# Altium footprint library Xavier_NX_Carrier_Board_v1.1.PcbLib: 52 footprints (part 1 of 4)
Each footprint in its own frame and in the unit in brackets; x right, y up, seen from the top. Pads: shape width x height; smd on the part's side, far side on the other; paste and mask are expansions set on the pad; w line width, h text height; cw(c..) or ccw(c..) is an arc to the next point about the centre after c.
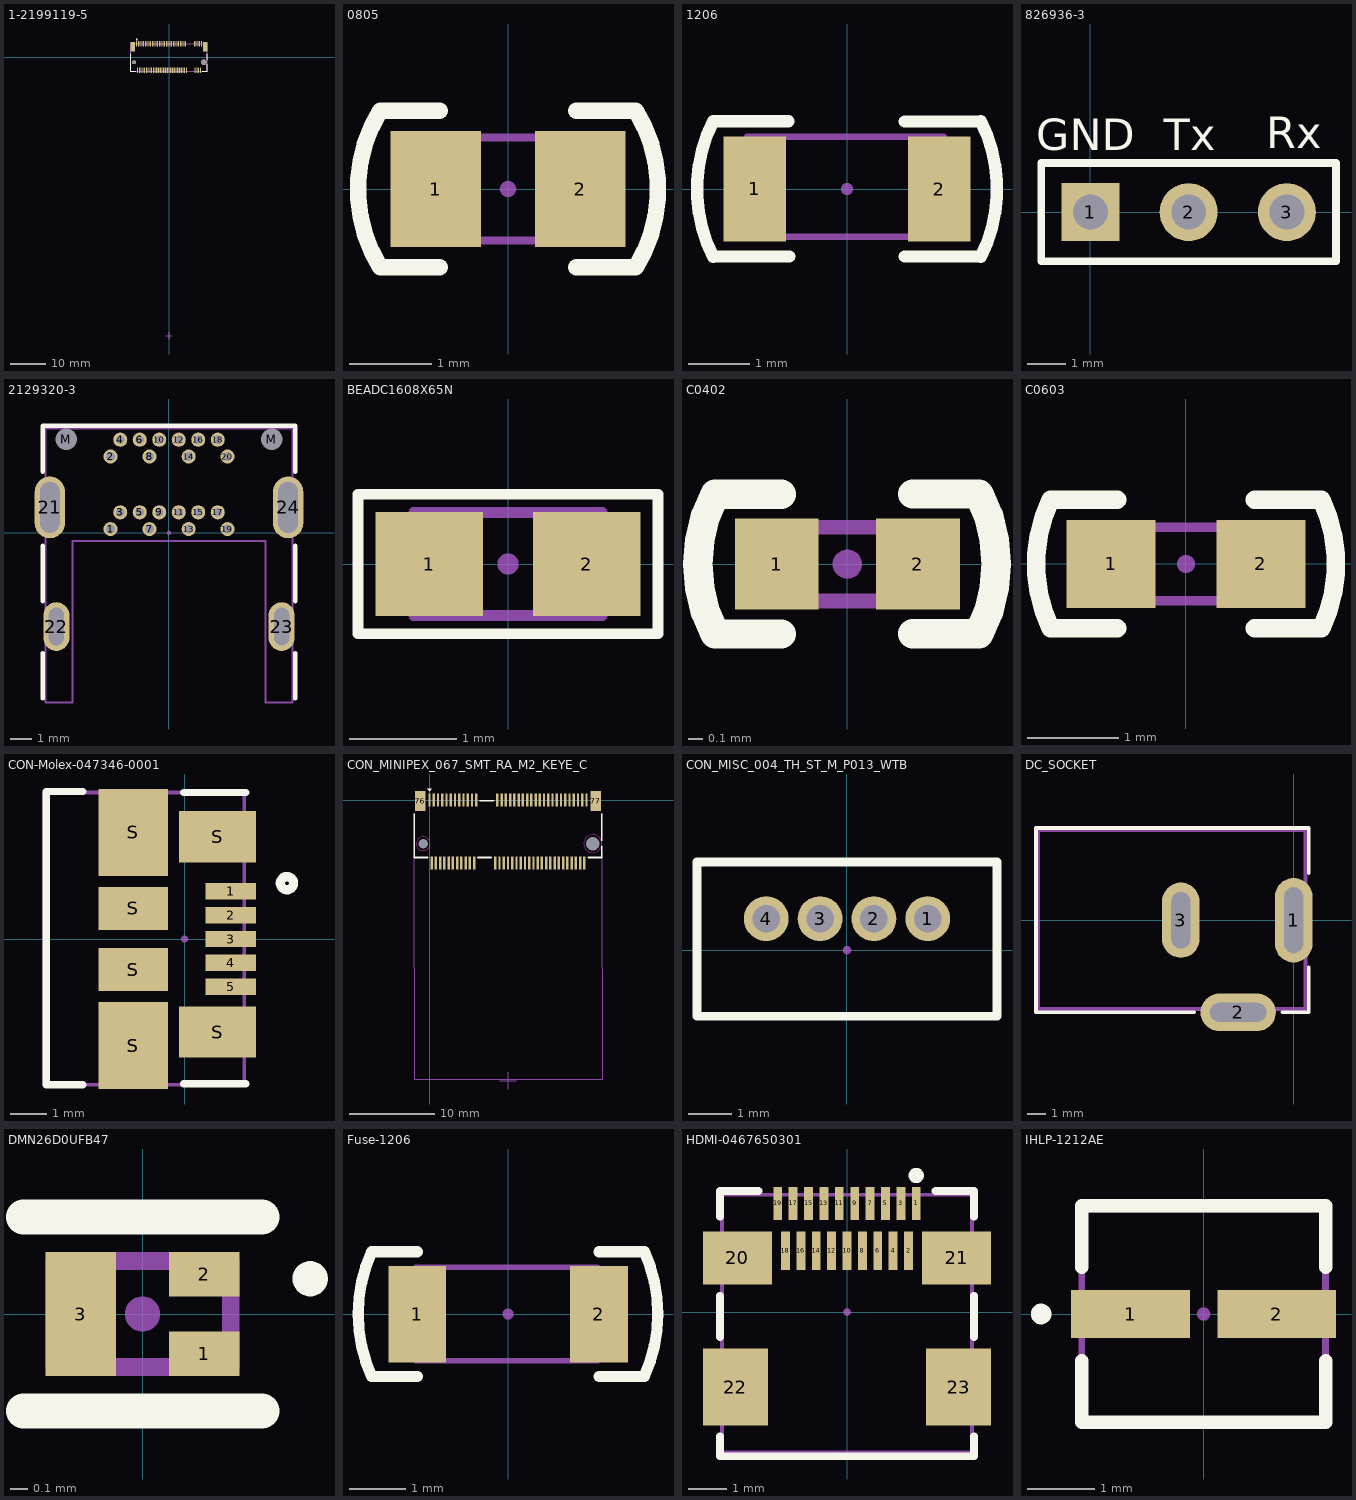
[diagram p0: the footprints below, top view; thin cyan lines are the x and y axes]

## 1-2199119-5 [mm]
pads (72):
  rect 0.3x1.55 smd mask+0.05: 1(-9.25,3.775) 2(-9,-3.775) 3(-8.75,3.775) 4(-8.5,-3.775) 5(-8.25,3.775) 6(-8,-3.775) 7(-7.75,3.775) 8(-7.5,-3.775) 9(-7.25,3.775) 10(-7,-3.775) 11(-6.75,3.775) 12(-6.5,-3.775) 13(-6.25,3.775) 14(-6,-3.775) 15(-5.75,3.775) 16(-5.5,-3.775) 17(-5.25,3.775) 18(-5,-3.775) 19(-4.75,3.775) 20(-4.5,-3.775) 21(-4.25,3.775) 22(-4,-3.775) 23(-3.75,3.775) 24(-3.5,-3.775) 25(-3.25,3.775) 26(-3,-3.775) 27(-2.75,3.775) 28(-2.5,-3.775) 29(-2.25,3.775) 30(-2,-3.775) 31(-1.75,3.775) 32(-1.5,-3.775) 33(-1.25,3.775) 34(-1,-3.775) 35(-0.75,3.775) 36(-0.5,-3.775) 37(-0.25,3.775) 38(0,-3.775) 39(0.25,3.775) 40(0.5,-3.775) 41(0.75,3.775) 42(1,-3.775) 43(1.25,3.775) 44(1.5,-3.775) 45(1.75,3.775) 46(2,-3.775) 47(2.25,3.775) 48(2.5,-3.775) 49(2.75,3.775) 50(3,-3.775) 51(3.25,3.775) 52(3.5,-3.775) 53(3.75,3.775) 54(4,-3.775) 55(4.25,3.775) 56(4.5,-3.775) 57(4.75,3.775) 58(5,-3.775) 67(7.25,3.775) 68(7.5,-3.775) 69(7.75,3.775) 70(8,-3.775) 71(8.25,3.775) 72(8.5,-3.775) 73(8.75,3.775) 74(9,-3.775) 75(9.25,3.775)
  round 1.1 hole 1.1 unplated mask+0.05: None(-10,-1.5)
  round 1.6 hole 1.6 unplated mask+0.05: None(10,-1.5)
  rect 1.2x2.75 smd mask+0.05: SH1(-10.35,3) SH2(10.35,3)
  round 0.2 on Mech4: ""(0,0)
Top Overlay:
  circle w0.2: c-9.225,5.075 r0.1
  lines w0.2: -10.95,1 -10.95,-4 -9.5,-4 ; 9.5,-4 10.95,-4 10.95,-2.1 ; 10.95,-0.9 10.95,1
Mechanical 3:
  lines w0.1: -1,-79.685 1,-79.685 ; 0,-80.685 0,-78.685
Mechanical 4:
  circle w0.2: c-9.25,4.115 r0.1
  circle w0.2: c-9.25,4.115 r0.1
  lines w0.1: -10.95,-4 10.95,-4 ; -10.95,-4 -10.95,3.75 ; -10.95,-4 10.95,-4 ; -10.95,-4 -10.95,3.75 ; -10.95,3.75 10.95,3.75 ; -10.95,3.75 10.95,3.75 ; 10.95,-4 10.95,3.75 ; 10.95,-4 10.95,3.75
3D body "M2 SSD.STEP": height 2.51, standoff 0.65, extent -10.975,-79.575 11.025,0.425
3D body "c-1-2199119-5-c-3d.stp": height 3.09, standoff -0.54, extent -10.97,-4.36 10.93,4.34

## 0805 [mm]
pads (3):
  rect 1.1x1.4 smd mask+0.05: 1(-0.875,0) 2(0.875,0)
  round 0.2 on Mech4: ""(0,0)
Top Overlay:
  lines w0.2: -0.825,-0.95 -1.55,-0.95 cw(c0,0) -1.55,0.95 -0.825,0.95 ; 0.825,-0.95 1.55,-0.95 ccw(c0,0) 1.55,0.95 0.825,0.95
Mechanical 4:
  lines w0.1: -1,-0.625 1,-0.625 1,0.625 -1,0.625 -1,-0.625
3D body "CAP0805.stp": height 0.78, standoff 0, extent -1,-0.625 1,0.625
3D body: height 0.45, standoff 0, extent 1,-0.625 1,0.625
3D body: height 0.45, standoff 0, extent -1,-0.625 -1,0.625

## 1206 [mm]
pads (3):
  rect 1.016x1.7 smd mask+0.05: 1(-1.5,0) 2(1.5,0)
  round 0.2 on Mech4: ""(0,0)
Top Overlay:
  lines w0.2: -2.175,-1.1 cw(c0,0) -2.175,1.1 -0.95,1.1 ; -2.163,-1.098 -0.938,-1.098 ; 0.938,-1.098 2.163,-1.098 ; 0.938,1.098 2.163,1.098 ; 2.175,-1.1 ccw(c0,0) 2.175,1.1
Mechanical 4:
  lines w0.1: -1.625,-0.775 -1.625,0.85 1.575,0.85 1.575,-0.775 -1.625,-0.775
3D body "R1206.step": height 0.61, standoff -0.01, extent -1.627,-0.787 1.577,0.838

## 826936-3 [mm]
pads (4):
  rect 1.5x1.5 hole 0.9 paste-10 mask+0.05: 1(0,0)
  round 1.5 hole 0.9 paste-10 mask+0.05: 2(2.54,0) 3(5.08,0)
  round 0.2 on Mech4 paste-10 mask-10: ""(0,0)
Top Overlay:
  lines w0.2: -1.27,-1.27 6.35,-1.27 6.35,1.27 -1.27,1.27 -1.27,-1.27
  text "GND" at -1.408,1.602 h0.81
  text "Rx" at 4.542,1.652 h0.81
  text "Tx" at 1.892,1.602 h0.81
Mechanical 4:
  lines w0.1: -1.25,-1.25 6.35,-1.25 6.35,1.25 -1.25,1.25 -1.25,-1.25
Mechanical 13:
  lines w0.01: -1.25,-1.25 6.35,-1.25 6.35,1.25 -1.25,1.25 -1.25,-1.25
3D body "Samtec-TSW-103-07-G-S, Jumper with 3 pins, male.step": height 8.4, standoff -2.52, extent -1.27,-1.27 6.35,1.27

## 2129320-3 [mm]
pads (27):
  round 0.65 hole 0.4 mask+0.05: 1(-2.7,0.175) 2(-2.7,3.525) 3(-2.25,0.95) 4(-2.25,4.3) 5(-1.35,0.95) 6(-1.35,4.3) 7(-0.9,0.175) 8(-0.9,3.525) 9(-0.45,0.95) 10(-0.45,4.3) 11(0.45,0.95) 12(0.45,4.3) 13(0.908,0.175) 14(0.908,3.525) 15(1.35,0.95) 16(1.35,4.3) 17(2.25,0.95) 18(2.25,4.3) 19(2.7,0.175) 20(2.7,3.525)
  oval 1.4x2.85 hole 0.9 slot 2.35 at 90 deg mask+0.05: 21(-5.5,1.175) 24(5.5,1.175)
  oval 1.2x2.25 hole 0.7 slot 1.74 at 90 deg mask+0.05: 22(-5.2,-4.325) 23(5.2,-4.325)
  round 0.75 hole 1 mask+0.05: M(-4.75,4.325) M(4.75,4.325)
  round 0.2 on Mech4: ""(0,0)
Top Overlay:
  lines w0.2: -5.825,-7.65 -5.825,-5.55 ; -5.825,-3.15 -5.825,-0.6 ; -5.825,2.825 -5.825,4.95 5.825,4.95 5.825,2.825 ; 5.825,-7.65 5.825,-5.55 ; 5.825,-3.15 5.825,-0.6
Mechanical 4:
  lines w0.1: -5.7,-7.825 -5.7,4.825 5.7,4.825 5.7,-7.825 4.45,-7.825 4.45,-0.375 -4.45,-0.375 -4.45,-7.825 -5.7,-7.825
3D body "c-2129320-3-b-3d.stp": height 4.18, standoff -2.22, extent -5.7,-7.825 5.7,4.825

## BEADC1608X65N [mm]
pads (3):
  rect 1x0.97 smd mask+0.05: 1(-0.735,0) 2(0.735,0)
  round 0.2 on Mech4: ""(0,0)
Top Overlay:
  lines w0.1: -1.4,-0.65 1.4,-0.65 1.4,0.65 -1.4,0.65 -1.4,-0.65
Mechanical 4:
  lines w0.1: -0.88,-0.48 -0.88,0.48 0.88,0.48 0.88,-0.48 -0.88,-0.48
3D body "BLM18SG121TN1D.STEP": height 0.65, standoff 0, extent -0.8,-0.4 0.8,0.4

## C0402 [mm]
pads (3):
  rect 0.57x0.62 smd mask+0.05: 1(-0.48,0) 2(0.48,0)
  round 0.2 on Mech4: ""(0,0)
Top Overlay:
  lines w0.2: -0.45,-0.475 -0.9,-0.475 cw(c0,0) -0.9,0.475 -0.45,0.475 ; 0.446,-0.473 0.896,-0.473 ccw(c-0.004,0.002) 0.896,0.477 0.446,0.477
Mechanical 4:
  lines w0.1: -0.5,-0.25 -0.5,0.25 0.5,0.25 0.5,-0.25 -0.5,-0.25
3D body "User Library-C0402-1.STEP": height 0.47, standoff -0.03, extent -0.498,-0.25 0.498,0.25

## C0603 [mm]
pads (3):
  rect 0.97x0.96 smd mask+0.05: 1(-0.815,0) 2(0.815,0)
  round 0.2 on Mech4: ""(0,0)
Top Overlay:
  lines w0.2: -0.75,-0.7 -1.475,-0.7 cw(c0,0) -1.475,0.7 -0.75,0.7 ; 0.75,-0.7 1.475,-0.7 ccw(c0,0) 1.475,0.7 0.75,0.7
Mechanical 4:
  lines w0.1: -0.825,-0.4 -0.825,0.4 0.825,0.4 0.825,-0.4 -0.825,-0.4
3D body "User Library-C0603-2.STEP": height 0.8, standoff 0, extent -0.8,-0.4 0.8,0.4

## CON-Molex-047346-0001 [mm]
pads (12):
  rect 1.38x0.45 smd mask+0.05: 1(1.263,1.3) 2(1.263,0.65) 3(1.263,0) 4(1.263,-0.65) 5(1.263,-1.3)
  rect 1.9x2.37 smd mask+0.05: S(-1.397,-2.91) S(-1.397,2.91)
  rect 1.9x1.175 smd mask+0.05: S(-1.397,-0.837) S(-1.397,0.837)
  rect 2.1x1.4 smd mask+0.05: S(0.903,-2.54) S(0.903,2.794)
  round 0.2 on Mech4: ""(0,0)
Top Overlay:
  circle w0.254: c2.794,1.524 r0.18
  lines w0.1: -3.8,4.025 -3.775,4.025
  lines w0.2: -2.775,-3.975 -3.775,-3.975 -3.775,4.025 -2.775,4.025 ; -0.025,-3.95 1.675,-3.95 ; -0.025,4 1.675,4
Mechanical 4:
  lines w0.1: -3.825,3.975 -3.825,-3.975 1.625,-3.975 ; -3.8,4 1.625,4 1.625,-3.975 ; 1.625,-3.975 1.625,-3.975
3D body "CON-Molex-47346-0001.stp": height 2.71, standoff -0.23, extent -3.796,-3.99 1.634,3.99

## CON_MINIPEX_067_SMT_RA_M2_KEYE_C [mm]
pads (72):
  rect 0.28x1.55 smd: 1(0,0) 2(0.25,-7.4) 3(0.5,0) 4(0.75,-7.4) 5(1,0) 6(1.25,-7.4) 7(1.5,0) 8(1.75,-7.4) 9(2,0) 10(2.25,-7.4) 11(2.5,0) 12(2.75,-7.4) 13(3,0) 14(3.25,-7.4) 15(3.5,0) 16(3.75,-7.4) 17(4,0) 18(4.25,-7.4) 19(4.5,0) 20(4.75,-7.4) 21(5,0) 22(5.25,-7.4) 23(5.5,0) 32(7.75,-7.4) 33(8,0) 34(8.25,-7.4) 35(8.5,0) 36(8.75,-7.4) 37(9,0) 38(9.25,-7.4) 39(9.5,0) 40(9.75,-7.4) 41(10,0) 42(10.25,-7.4) 43(10.5,0) 44(10.75,-7.4) 45(11,0) 46(11.25,-7.4) 47(11.5,0) 48(11.75,-7.4) 49(12,0) 50(12.25,-7.4) 51(12.5,0) 52(12.75,-7.4) 53(13,0) 54(13.25,-7.4) 55(13.5,0) 56(13.75,-7.4) 57(14,0) 58(14.25,-7.4) 59(14.5,0) 60(14.75,-7.4) 61(15,0) 62(15.25,-7.4) 63(15.5,0) 64(15.75,-7.4) 65(16,0) 66(16.25,-7.4) 67(16.5,0) 68(16.75,-7.4) 69(17,0) 70(17.25,-7.4) 71(17.5,0) 72(17.75,-7.4) 73(18,0) 74(18.25,-7.4) 75(18.5,0)
  rect 1.2x2.39 smd: 76(-1.1,-0.115) 77(19.6,-0.115)
  round 0.13 / inner round 0 / far side round 0.13 hole 1.1 unplated: ""(-0.75,-5.125)
  round 0.2 on Mech4: ""(0,0)
  round 0.13 / inner round 0 / far side round 0.13 hole 1.6 unplated: ""(19.25,-5.125)
Top Overlay:
  region: 0.283,1.312 0,1.029 -0.283,1.312
  lines w0.2: -1.815,-1.63 -1.815,-6.765 -0.21,-6.765 ; 5.71,-6.765 7.29,-6.765 ; 5.96,-0.085 7.54,-0.085 ; 18.71,-6.765 20.315,-6.765 20.315,-5.472 ; 20.315,-4.778 20.315,-1.63
Keep-Out Layer:
  circle w0.1: c19.25,-5.125 r1.051
  lines w0.1: 0.057,-5.125 cw(c-0.75,-5.125) 0.057,-5.111
Mechanical 3:
  lines w0.1: 8.25,-33.049 10.25,-33.049 ; 9.25,-34.049 9.25,-32.049
Mechanical 4:
  lines w0.1: -1.85,-6.76 -1.8,-32.9 20.35,-32.9 20.3,-6.81

## CON_MISC_004_TH_ST_M_P013_WTB [mm]
pads (5):
  round 1.04 / inner round 0 / far side round 1.04 hole 0.64 mask+0.05: 1(1.875,0.73) 2(0.625,0.73) 3(-0.625,0.73) 4(-1.875,0.73)
  round 0.2 on Mech4: ""(0,0)
Top Overlay:
  lines w0.2: -3.48,-1.535 -3.48,2.045 3.48,2.045 3.48,-1.535 -3.48,-1.535
Mechanical 4:
  lines w0.1: -3.475,-1.525 -3.475,2.05 3.475,2.05 3.475,-1.525 -3.475,-1.525

## DC_SOCKET [mm]
pads (4):
  oval 2x4.5 hole 1 slot 3.5 at 90 deg mask+0.05: 1(0,0)
  oval 4x2 hole 1 slot 3 at 0 deg mask+0.05: 2(-2.95,-4.9)
  oval 2x4 hole 1 slot 3 at 90 deg mask+0.05: 3(-6,0)
  round 0.2 on Mech4: ""(0,0)
Top Overlay:
  lines w0.2: -5.3,-4.9 -13.7,-4.9 -13.7,4.9 0.8,4.9 0.8,2.5 ; -0.6,-4.9 0.8,-4.9 0.8,-2.5
Mechanical 4:
  lines w0.2: -13.6,-4.725 0.625,-4.725 0.625,4.8 -13.6,4.8 -13.6,-4.725
3D body "DC-10A.step": height 11.01, standoff -3.49, extent -13.7,-5.1 0.4,4.5

## DMN26D0UFB47 [mm]
pads (4):
  rect 0.4x0.25 smd mask+0.05: 1(0.35,-0.225) 2(0.35,0.225)
  rect 0.4x0.7 smd mask+0.05: 3(-0.35,0)
  round 0.2 on Mech4: ""(0,0)
Top Overlay:
  lines w0.1: 0.9,0.2 ccw(c0.95,0.2) 1,0.2 ccw(c0.95,0.2) 0.9,0.2
  lines w0.2: -0.675,-0.55 0.675,-0.55 ; -0.675,0.55 0.675,0.55
Mechanical 4:
  lines w0.1: -0.5,-0.3 -0.5,0.3 0.5,0.3 0.5,-0.3 -0.5,-0.3
3D body "DMN26D0UFB4-7.stp": height 0.5, standoff 0, extent -0.51,-0.325 0.525,0.325

## Fuse-1206 [mm]
pads (3):
  rect 1.016x1.7 smd mask+0.05: 1(-1.6,0) 2(1.6,0)
  round 0.2 on Mech4: ""(0,0)
Top Overlay:
  lines w0.2: -1.6,-1.1 -2.4,-1.1 cw(c0,0) -2.4,1.1 -1.6,1.1 ; 1.6,-1.1 2.4,-1.1 ; 1.6,1.1 2.4,1.1 ; 2.397,-1.098 ccw(c-0.003,0.002) 2.397,1.102
Mechanical 4:
  lines w0.1: -1.625,-0.825 -1.625,0.825 1.575,0.825 1.575,-0.825 -1.625,-0.825
3D body "User Library-Litttlefuse 1206.step": height 1.43, standoff -0.03, extent -1.626,-0.825 1.576,0.827

## HDMI-0467650301 [mm]
pads (24):
  rect 0.23x0.85 smd mask+0.05: 1(1.8,2.825) 3(1.4,2.825) 5(1,2.825) 7(0.6,2.825) 9(0.2,2.825) 11(-0.2,2.825) 13(-0.6,2.825) 15(-1,2.825) 17(-1.4,2.825) 19(-1.8,2.825)
  rect 0.23x1 smd mask+0.05: 2(1.6,1.6) 4(1.2,1.6) 6(0.8,1.6) 8(0.4,1.6) 10(0,1.6) 12(-0.4,1.6) 14(-0.8,1.6) 16(-1.2,1.6) 18(-1.6,1.6)
  rect 1.8x1.38 smd mask+0.05: 20(-2.85,1.41) 21(2.85,1.41)
  rect 1.7x2 smd mask+0.05: 22(-2.9,-1.95) 23(2.9,-1.95)
  round 0.2 on Mech4: ""(0,0)
Top Overlay:
  lines w0.2: -3.3,-3.225 -3.3,-3.75 3.3,-3.75 3.3,-3.225 ; -3.3,-0.65 -3.3,0.425 ; -3.3,2.475 -3.3,3.15 -2.3,3.15 ; 2.3,3.15 3.3,3.15 3.3,2.475 ; 3.3,-0.65 3.3,0.425 ; 1.7,3.55 ccw(c1.8,3.55) 1.9,3.55 ccw(c1.8,3.55) 1.7,3.55
Mechanical 4:
  lines w0.1: -3.25,-3.65 3.25,-3.65 3.25,3.05 -3.25,3.05 -3.25,-3.65
3D body "467650301.stp": height 2.98, standoff 0.01, extent -3.275,-4.4 3.225,3.1

## IHLP-1212AE [mil]
pads (3):
  rect 69x28 smd mask+1.97: 1(-42.5,0) 2(42.5,0)
  round 7.87 on Mech4: ""(0,0)
Top Overlay:
  circle w6: c-94.49,0 r3
  lines w7.87: -71,-27.1 -71,-63 71,-63 71,-27.1 ; -71,27.1 -71,63 71,63 71,27.1
Mechanical 4:
  lines w3.94: -70.87,-62.01 70.87,-62.01 70.87,61.02 -70.87,61.02 -70.87,-62.01
3D body "IHLP-1212AE.stp": height 61, standoff 0, extent -71,-63 71,63